# Altium footprint library Miscellaneous THD.PcbLib: 216 footprints (part 2 of 15) (continued)
## BELFUSE_L829-1J1T-43 [mm] "1 Port, Yellow/Green-Orange LEDs, Gigabit Ethernet, MagJack Connector Module" (continued)
Mechanical 14:
  lines w0.1: -8.79,20.2 ccw(c2.676,16.42) -8.923,13.07 -9.235,13.07 cw(c2.676,16.42) -8.79,21.07 ; -6.147,13.72 -6.147,21.07 ; -6.147,13.721 ccw(c-5.097,13.72) -4.047,13.719 -4.047,21.07 ; -5.7,21.07 -5.503,13.177 ; -5.466,13.157 ccw(c-5.097,13.89) -4.692,13.177 -4.494,21.07 ; 4.047,13.72 4.047,21.07 ; 4.047,13.721 ccw(c5.097,13.72) 6.147,13.719 6.147,21.07 ; 4.494,21.07 4.692,13.177 ; 4.728,13.157 ccw(c5.097,13.89) 5.503,13.177 5.7,21.07 ; 8.79,20.2 cw(c-2.676,16.42) 8.923,13.07 9.235,13.07 ccw(c-2.676,16.42) 8.79,21.07 ; -8.79,21.07 8.79,21.07 ; -8.79,21.07 -8.79,-3.06 8.79,-3.06 8.79,21.07
3D body "BELFUSE_L829-1J1T-43.stp": height 12.2, standoff -3.3, extent -9.694,-3.06 9.694,21.07

## BELFUSE_SI-16001-F [mm] "1 Port, Without LED, RJ45 10/100Base-T Ethernet Vertical Connector Module With Integrated Magnetics"
height 17.27
pads (12):
  round 1.6 hole 0.9: 1(-4.445,-1.27) 2(-3.175,1.27) 3(-1.905,-1.27) 4(-0.635,1.27) 5(0.635,-1.27) 6(1.905,1.27) 7(3.175,-1.27) 8(4.445,1.27)
  round 2.3 hole 1.6: 9(-7.875,-3.73) 10(7.875,-3.73)
  round 1 hole 3.2 unplated mask+1.1: M1(-5.715,-7.62) M2(5.715,-7.62)
Top Overlay:
  lines w0.2: -8.13,-5.259 -8.13,-14.4 8.13,-14.4 8.13,-5.259 ; -8.13,-2.201 -8.13,2.62 8.13,2.62 8.13,-2.201 ; -6.2,-9.56 -6.2,-10.87 ccw(c-6,-10.87) -6,-11.07 -3.595,-11.07 cw(c-3.595,-11.27) -3.395,-11.27 -3.395,-12.67 ccw(c-3.195,-12.67) -3.195,-12.87 -2.475,-12.87 cw(c-2.475,-13.07) -2.275,-13.07 -2.275,-14.05 2.275,-14.05 2.275,-13.07 cw(c2.475,-13.07) 2.475,-12.87 3.195,-12.87 ccw(c3.195,-12.67) 3.395,-12.67 3.395,-11.27 cw(c3.595,-11.27) 3.595,-11.07 6,-11.07 ccw(c6,-10.87) 6.2,-10.87 6.2,-9.56 ; -6.2,-5.68 -6.2,-3.96 cw(c-6,-3.96) -6,-3.76 6,-3.76 cw(c6,-3.96) 6.2,-3.96 6.2,-5.68 ; -5.955,-9.76 -3.15,-9.76 ; -5.955,-9.606 -5.955,-10.9 -3.15,-10.9 ; -5.955,-5.634 -5.955,-4.07 5.955,-4.07 5.955,-5.634 ; -3.78,-4.07 -3.78,-7.304 -3.32,-7.304 -3.32,-4.07 ; -2.764,-4.07 -2.764,-7.304 -2.304,-7.304 -2.304,-4.07 ; -1.748,-4.07 -1.748,-7.304 -1.288,-7.304 -1.288,-4.07 ; -0.732,-4.07 -0.732,-7.304 -0.272,-7.304 -0.272,-4.07 ; 0.284,-4.07 0.284,-7.304 0.744,-7.304 0.744,-4.07 ; 1.3,-4.07 1.3,-7.304 1.76,-7.304 1.76,-4.07 ; 2.316,-4.07 2.316,-7.304 2.776,-7.304 2.776,-4.07 ; 3.15,-10.9 5.955,-10.9 5.955,-9.606 ; 3.15,-9.76 5.955,-9.76 ; 3.332,-4.07 3.332,-7.304 3.792,-7.304 3.792,-4.07 ; -3.15,-12.57 -3.15,-8.49 3.15,-8.49 3.15,-12.57 2.03,-12.57 2.03,-13.87 -2.03,-13.87 -2.03,-12.57 -3.15,-12.57
Mechanical 8:
  lines w0.1: -8.375,-3.73 -7.875,-3.73 ; -7.875,-4.23 -7.875,-3.73 ; -7.875,-3.23 -7.875,-3.73 ; -7.375,-3.73 -7.875,-3.73 ; -6.215,-7.62 -5.715,-7.62 ; -5.715,-8.12 -5.715,-7.62 ; -5.715,-7.12 -5.715,-7.62 ; -5.215,-7.62 -5.715,-7.62 ; -4.945,-1.27 -4.445,-1.27 ; -4.445,-1.77 -4.445,-1.27 ; -4.445,-0.77 -4.445,-1.27 ; -3.945,-1.27 -4.445,-1.27 ; -3.675,1.27 -3.175,1.27 ; -3.175,0.77 -3.175,1.27 ; -3.175,1.77 -3.175,1.27 ; -2.675,1.27 -3.175,1.27 ; -2.405,-1.27 -1.905,-1.27 ; -1.905,-1.77 -1.905,-1.27 ; -1.905,-0.77 -1.905,-1.27 ; -1.405,-1.27 -1.905,-1.27 ; -1.135,1.27 -0.635,1.27 ; -0.635,0.77 -0.635,1.27 ; -0.635,1.77 -0.635,1.27 ; -0.5,0 0,0 ; -0.135,1.27 -0.635,1.27 ; 0,-0.5 0,0 ; 0,0.5 0,0 ; 0.135,-1.27 0.635,-1.27 ; 0.5,0 0,0 ; 0.635,-1.77 0.635,-1.27 ; 0.635,-0.77 0.635,-1.27 ; 1.135,-1.27 0.635,-1.27 ; 1.405,1.27 1.905,1.27 ; 1.905,0.77 1.905,1.27 ; 1.905,1.77 1.905,1.27 ; 2.405,1.27 1.905,1.27 ; 2.675,-1.27 3.175,-1.27 ; 3.175,-1.77 3.175,-1.27 ; 3.175,-0.77 3.175,-1.27 ; 3.675,-1.27 3.175,-1.27 ; 3.945,1.27 4.445,1.27 ; 4.445,0.77 4.445,1.27 ; 4.445,1.77 4.445,1.27 ; 4.945,1.27 4.445,1.27 ; 5.215,-7.62 5.715,-7.62 ; 5.715,-8.12 5.715,-7.62 ; 5.715,-7.12 5.715,-7.62 ; 6.215,-7.62 5.715,-7.62 ; 7.375,-3.73 7.875,-3.73 ; 7.875,-4.23 7.875,-3.73 ; 7.875,-3.23 7.875,-3.73 ; 8.375,-3.73 7.875,-3.73
Mechanical 14:
  lines w0.1: -6.635,-8.5 -5.449,-8.5 -5.449,-6.47 -6.635,-6.47 ; -5.955,-9.76 -3.15,-9.76 ; -5.955,-8.5 -5.955,-10.9 -3.15,-10.9 ; -5.955,-6.47 -5.955,-4.07 5.955,-4.07 5.955,-6.47 ; -3.78,-4.07 -3.78,-7.304 -3.32,-7.304 -3.32,-4.07 ; -2.764,-4.07 -2.764,-7.304 -2.304,-7.304 -2.304,-4.07 ; -1.748,-4.07 -1.748,-7.304 -1.288,-7.304 -1.288,-4.07 ; -0.732,-4.07 -0.732,-7.304 -0.272,-7.304 -0.272,-4.07 ; 0.284,-4.07 0.284,-7.304 0.744,-7.304 0.744,-4.07 ; 1.3,-4.07 1.3,-7.304 1.76,-7.304 1.76,-4.07 ; 2.316,-4.07 2.316,-7.304 2.776,-7.304 2.776,-4.07 ; 3.15,-10.9 5.955,-10.9 5.955,-8.5 ; 3.15,-9.76 5.954,-9.76 ; 3.332,-4.07 3.332,-7.304 3.792,-7.304 3.792,-4.07 ; 6.635,-8.5 5.48,-8.5 5.48,-6.47 6.635,-6.47 ; -8.13,-14.4 -8.13,2.62 8.13,2.62 8.13,-14.4 -8.13,-14.4 ; -6.635,-9.01 -6.2,-9.01 -6.2,-10.87 ccw(c-6,-10.87) -6,-11.07 -3.595,-11.07 cw(c-3.595,-11.27) -3.395,-11.27 -3.395,-12.67 ccw(c-3.195,-12.67) -3.195,-12.87 -2.475,-12.87 cw(c-2.475,-13.07) -2.275,-13.07 -2.275,-14.05 2.275,-14.05 2.275,-13.07 cw(c2.475,-13.07) 2.475,-12.87 3.195,-12.87 ccw(c3.195,-12.67) 3.395,-12.67 3.395,-11.27 cw(c3.595,-11.27) 3.595,-11.07 6,-11.07 ccw(c6,-10.87) 6.2,-10.87 6.2,-9.01 6.635,-9.01 6.635,-5.96 6.2,-5.96 6.2,-3.96 ccw(c6,-3.96) 6,-3.76 -6,-3.76 ccw(c-6,-3.96) -6.2,-3.96 -6.2,-5.96 -6.635,-5.96 -6.635,-9.01 ; -3.15,-12.57 -3.15,-8.49 3.15,-8.49 3.15,-12.57 2.03,-12.57 2.03,-13.87 -2.03,-13.87 -2.03,-12.57 -3.15,-12.57
3D body "BELFUSE_SI-16001-F.stp": height 17.02, standoff -4, extent -8.13,-14.4 8.13,2.62

## BELFUSE_SI-46014-F [mm] "1 Port, Yellow/ Green LEDs, RJ45 10/100Base-T Ethernet, MagJack® Vertical Connector Module"
height 17.27
pads (16):
  round 1.6 hole 0.9: 1(-4.445,-1.27) 2(-3.175,1.27) 3(-1.905,-1.27) 4(-0.635,1.27) 5(0.635,-1.27) 6(1.905,1.27) 7(3.175,-1.27) 8(4.445,1.27)
  round 1.7 hole 1: 9(-6.325,-11.73) 10(-3.785,-11.73) 11(3.785,-11.73) 12(6.325,-11.73)
  round 2.3 hole 1.6: 13(-7.875,-3.73) 14(7.875,-3.73)
  round 1 hole 3.2 unplated mask+1.1: M1(-5.715,-7.62) M2(5.715,-7.62)
Top Overlay:
  lines w0.2: -8.13,-5.259 -8.13,-14.4 8.13,-14.4 8.13,-5.259 ; -8.13,-2.201 -8.13,2.62 8.13,2.62 8.13,-2.201 ; -6.2,-10.537 -6.2,-9.56 ; -6.2,-5.68 -6.2,-3.96 cw(c-6,-3.96) -6,-3.76 6,-3.76 cw(c6,-3.96) 6.2,-3.96 6.2,-5.68 ; -5.955,-10.588 -5.955,-9.606 ; -5.955,-9.76 -3.15,-9.76 ; -5.955,-5.634 -5.955,-4.07 5.955,-4.07 5.955,-5.634 ; -5.458,-10.9 -4.652,-10.9 ; -5.323,-11.07 -4.787,-11.07 ; -3.78,-4.07 -3.78,-7.304 -3.32,-7.304 -3.32,-4.07 ; -3.195,-12.87 -2.475,-12.87 cw(c-2.475,-13.07) -2.275,-13.07 -2.275,-14.05 2.275,-14.05 2.275,-13.07 cw(c2.475,-13.07) 2.475,-12.87 3.195,-12.87 ; -3.15,-10.712 -3.15,-8.49 3.15,-8.49 3.15,-10.712 ; -2.928,-12.57 -2.03,-12.57 -2.03,-13.87 2.03,-13.87 2.03,-12.57 2.928,-12.57 ; -2.764,-4.07 -2.764,-7.304 -2.304,-7.304 -2.304,-4.07 ; -1.748,-4.07 -1.748,-7.304 -1.288,-7.304 -1.288,-4.07 ; -0.732,-4.07 -0.732,-7.304 -0.272,-7.304 -0.272,-4.07 ; 0.284,-4.07 0.284,-7.304 0.744,-7.304 0.744,-4.07 ; 1.3,-4.07 1.3,-7.304 1.76,-7.304 1.76,-4.07 ; 2.316,-4.07 2.316,-7.304 2.776,-7.304 2.776,-4.07 ; 3.15,-9.76 5.955,-9.76 ; 3.332,-4.07 3.332,-7.304 3.792,-7.304 3.792,-4.07 ; 4.652,-10.9 5.458,-10.9 ; 4.787,-11.07 5.323,-11.07 ; 5.955,-10.588 5.955,-9.606 ; 6.2,-10.537 6.2,-9.56
Mechanical 8:
  lines w0.05: -8.375,-3.73 -7.875,-3.73 ; -7.875,-4.23 -7.875,-3.73 ; -7.875,-3.23 -7.875,-3.73 ; -7.375,-3.73 -7.875,-3.73 ; -6.825,-11.73 -6.325,-11.73 ; -6.325,-12.23 -6.325,-11.73 ; -6.325,-11.23 -6.325,-11.73 ; -6.215,-7.62 -5.715,-7.62 ; -5.825,-11.73 -6.325,-11.73 ; -5.715,-8.12 -5.715,-7.62 ; -5.715,-7.12 -5.715,-7.62 ; -5.215,-7.62 -5.715,-7.62 ; -4.945,-1.27 -4.445,-1.27 ; -4.445,-1.77 -4.445,-1.27 ; -4.445,-0.77 -4.445,-1.27 ; -4.285,-11.73 -3.785,-11.73 ; -3.945,-1.27 -4.445,-1.27 ; -3.785,-12.23 -3.785,-11.73 ; -3.785,-11.23 -3.785,-11.73 ; -3.675,1.27 -3.175,1.27 ; -3.285,-11.73 -3.785,-11.73 ; -3.175,0.77 -3.175,1.27 ; -3.175,1.77 -3.175,1.27 ; -2.675,1.27 -3.175,1.27 ; -2.405,-1.27 -1.905,-1.27 ; -1.905,-1.77 -1.905,-1.27 ; -1.905,-0.77 -1.905,-1.27 ; -1.405,-1.27 -1.905,-1.27 ; -1.135,1.27 -0.635,1.27 ; -0.635,0.77 -0.635,1.27 ; -0.635,1.77 -0.635,1.27 ; -0.5,0 0,0 ; -0.135,1.27 -0.635,1.27 ; 0,-0.5 0,0 ; 0,0.5 0,0 ; 0.135,-1.27 0.635,-1.27 ; 0.5,0 0,0 ; 0.635,-1.77 0.635,-1.27 ; 0.635,-0.77 0.635,-1.27 ; 1.135,-1.27 0.635,-1.27 ; 1.405,1.27 1.905,1.27 ; 1.905,0.77 1.905,1.27 ; 1.905,1.77 1.905,1.27 ; 2.405,1.27 1.905,1.27 ; 2.675,-1.27 3.175,-1.27 ; 3.175,-1.77 3.175,-1.27 ; 3.175,-0.77 3.175,-1.27 ; 3.285,-11.73 3.785,-11.73 ; 3.675,-1.27 3.175,-1.27 ; 3.785,-12.23 3.785,-11.73 ; 3.785,-11.23 3.785,-11.73 ; 3.945,1.27 4.445,1.27 ; 4.285,-11.73 3.785,-11.73 ; 4.445,0.77 4.445,1.27 ; 4.445,1.77 4.445,1.27 ; 4.945,1.27 4.445,1.27 ; 5.215,-7.62 5.715,-7.62 ; 5.715,-8.12 5.715,-7.62 ; 5.715,-7.12 5.715,-7.62 ; 5.825,-11.73 6.325,-11.73 ; 6.215,-7.62 5.715,-7.62 ; 6.325,-12.23 6.325,-11.73 ; 6.325,-11.23 6.325,-11.73 ; 6.825,-11.73 6.325,-11.73 ; 7.375,-3.73 7.875,-3.73 ; 7.875,-4.23 7.875,-3.73 ; 7.875,-3.23 7.875,-3.73 ; 8.375,-3.73 7.875,-3.73
Mechanical 14:
  lines w0.1: -6.635,-8.5 -5.449,-8.5 -5.449,-6.47 -6.635,-6.47 ; -5.955,-9.76 -3.15,-9.76 ; -5.955,-8.5 -5.955,-10.9 -3.15,-10.9 ; -5.955,-6.47 -5.955,-4.07 5.955,-4.07 5.955,-6.47 ; -3.78,-4.07 -3.78,-7.304 -3.32,-7.304 -3.32,-4.07 ; -2.764,-4.07 -2.764,-7.304 -2.304,-7.304 -2.304,-4.07 ; -1.748,-4.07 -1.748,-7.304 -1.288,-7.304 -1.288,-4.07 ; -0.732,-4.07 -0.732,-7.304 -0.272,-7.304 -0.272,-4.07 ; 0.284,-4.07 0.284,-7.304 0.744,-7.304 0.744,-4.07 ; 1.3,-4.07 1.3,-7.304 1.76,-7.304 1.76,-4.07 ; 2.316,-4.07 2.316,-7.304 2.776,-7.304 2.776,-4.07 ; 3.15,-10.9 5.955,-10.9 5.955,-8.5 ; 3.15,-9.76 5.954,-9.76 ; 3.332,-4.07 3.332,-7.304 3.792,-7.304 3.792,-4.07 ; 6.635,-8.5 5.48,-8.5 5.48,-6.47 6.635,-6.47 ; -8.13,-14.4 8.13,-14.4 8.13,2.62 -8.13,2.62 -8.13,-14.4 ; -6.635,-9.01 -6.635,-5.96 -6.2,-5.96 -6.2,-3.96 cw(c-6,-3.96) -6,-3.76 6,-3.76 cw(c6,-3.96) 6.2,-3.96 6.2,-5.96 6.635,-5.96 6.635,-9.01 6.2,-9.01 6.2,-10.87 cw(c6,-10.87) 6,-11.07 3.595,-11.07 ccw(c3.595,-11.27) 3.395,-11.27 3.395,-12.67 cw(c3.195,-12.67) 3.195,-12.87 2.475,-12.87 ccw(c2.475,-13.07) 2.275,-13.07 2.275,-14.05 -2.275,-14.05 -2.275,-13.07 ccw(c-2.475,-13.07) -2.475,-12.87 -3.195,-12.87 cw(c-3.195,-12.67) -3.395,-12.67 -3.395,-11.27 ccw(c-3.595,-11.27) -3.595,-11.07 -6,-11.07 cw(c-6,-10.87) -6.2,-10.87 -6.2,-9.01 -6.635,-9.01 ; -3.15,-12.57 -2.03,-12.57 -2.03,-13.87 2.03,-13.87 2.03,-12.57 3.15,-12.57 3.15,-8.49 -3.15,-8.49 -3.15,-12.57
3D body "BELFUSE_SI-46014-F.stp": height 17.02, standoff -4, extent -8.13,-14.4 8.13,2.62

## BOMAR_364A2595 [mm] "Dual Right Angle 50 Ohm BNC Jack, White Valox Case"
height 29.3
pads (6):
  round 1.6 hole 0.9: 1(-6.2,2.54) 2(-6.2,0) 3(-6.2,-2.54) 4(-3.66,0)
  round 2.7 hole 2: 6(2.69,-5.08) 7(2.69,5.08)
Top Overlay:
  drawing of 182 lines, arcs and shapes, not listed
Mechanical 8:
  lines w0.1: -6.7,-2.54 -6.2,-2.54 ; -6.7,0 -6.2,0 ; -6.7,2.54 -6.2,2.54 ; -6.2,-3.04 -6.2,-2.54 ; -6.2,-2.04 -6.2,-2.54 ; -6.2,-0.5 -6.2,0 ; -6.2,0.5 -6.2,0 ; -6.2,2.04 -6.2,2.54 ; -6.2,3.04 -6.2,2.54 ; -5.7,-2.54 -6.2,-2.54 ; -5.7,0 -6.2,0 ; -5.7,2.54 -6.2,2.54 ; -4.16,0 -3.66,0 ; -3.66,-0.5 -3.66,0 ; -3.66,0.5 -3.66,0 ; -3.16,0 -3.66,0 ; -0.5,0 0,0 ; 0,-0.5 0,0 ; 0,0.5 0,0 ; 0.5,0 0,0 ; 2.19,-5.08 2.69,-5.08 ; 2.19,5.08 2.69,5.08 ; 2.69,-5.58 2.69,-5.08 ; 2.69,-4.58 2.69,-5.08 ; 2.69,4.58 2.69,5.08 ; 2.69,5.58 2.69,5.08 ; 3.19,-5.08 2.69,-5.08 ; 3.19,5.08 2.69,5.08
Mechanical 14:
  drawing of 182 lines, arcs and shapes, not listed
3D body "BOMAR_364A2595.stp": height 29.3, standoff -3.6, extent -9.85,-7.5 29.25,7.5

## BULGIN_PX0580-PC-COL [mm] "10A 250Vac PC Flange Rear Mount Inlet IEC Connector"
height 32.1
pads (5):
  round 2.4 hole 1.7: 1(9.14,0) 2(0,0) 3(-9.14,0)
  round 5.5 hole 3.4: 4(-20,9.65) 4(20,9.65)
Top Overlay:
  lines w0.2: -24.9,15.95 24.9,15.95 ; -14.785,18.35 -14.785,21.35 14.785,21.35 14.785,18.35 ; -13.3,0.45 -10.727,0.45 ; -13.3,3.35 -22.4,3.35 cw(c-22.4,5.85) -24.9,5.85 -24.9,18.35 24.9,18.35 24.9,5.85 cw(c22.4,5.85) 22.4,3.35 13.3,3.35 ; -13.3,15.95 -13.3,-3.55 13.3,-3.55 13.3,15.95 ; -7.553,0.45 -1.587,0.45 ; -7.539,0.45 -7.539,15.95 ; -1,-2.257 1,-2.257 ; -0.7,-2.657 0.7,-2.657 ; -0.4,-3.057 0.3,-3.057 ; 0,-2.257 0,-1.657 ; 1.587,0.45 7.553,0.45 ; 7.539,0.45 7.539,15.95 ; 10.727,0.45 13.3,0.45
  text "L" at 8.843,-3.075 h1.5
  text "N" at -9.602,-3.075 h1.5
Mechanical 8:
  lines w0.1: -21,9.65 -20,9.65 ; -20,8.65 -20,9.65 ; -20,10.65 -20,9.65 ; -19,9.65 -20,9.65 ; -10.14,0 -9.14,0 ; -9.14,-1 -9.14,0 ; -9.14,1 -9.14,0 ; -8.14,0 -9.14,0 ; -1,0 0,0 ; 0,-1 0,0 ; 0,1 0,0 ; 1,0 0,0 ; 8.14,0 9.14,0 ; 9.14,-1 9.14,0 ; 9.14,1 9.14,0 ; 10.14,0 9.14,0 ; 19,9.65 20,9.65 ; 20,8.65 20,9.65 ; 20,10.65 20,9.65 ; 21,9.65 20,9.65
Mechanical 14:
  circle w0.1: c20,9.65 r1.7
  circle w0.1: c-20,9.65 r1.7
  lines w0.1: -24.9,15.95 24.9,15.95 ; -14.785,18.35 -14.785,21.35 14.785,21.35 14.785,18.35 ; -13.3,0.45 13.3,0.45 ; -13.3,3.35 -22.4,3.35 cw(c-22.4,5.85) -24.9,5.85 -24.9,18.35 24.9,18.35 24.9,5.85 cw(c22.4,5.85) 22.4,3.35 13.3,3.35 ; -13.3,15.95 -13.3,-3.55 13.3,-3.55 13.3,15.95 ; -7.539,0.45 -7.539,15.95 ; -1,-2.257 1,-2.257 ; -0.7,-2.657 0.7,-2.657 ; -0.4,-3.057 0.3,-3.057 ; 0,-2.257 0,-1.657 ; 7.539,0.45 7.539,15.95
  text "L" at 8.843,-3.075 h1.5
  text "N" at -9.602,-3.075 h1.5
3D body "BULGIN_PX0580-PC-COL.stp": height 27.8, standoff -3.6, extent -24.9,-3.55 24.9,21.35

## BULGIN_PX0675-PC-COL [mm] "10A 250Vac PC Flange Rear Mount Outlet IEC Connector"
height 30.4
pads (5):
  round 2.4 hole 1.7: 1(-7,0) 2(0,0) 3(7,0)
  round 5.5 hole 3.4: 4(-20,15.1) 4(20,15.1)
Top Overlay:
  lines w0.2: -25.05,21.5 25.05,21.5 ; -16.975,23.8 -16.95,23.825 -16.95,27.1 16.95,27.1 16.95,23.8 ; -15.9,8.7 -21.55,8.7 cw(c-21.55,12.2) -25.05,12.2 -25.05,23.8 25.05,23.8 25.05,12.2 cw(c21.55,12.2) 21.55,8.7 15.9,8.7 ; -15.9,21.5 -15.9,6.9 15.9,6.9 15.9,21.5 ; -14.775,6.9 -14.775,5.77 -13.65,5.77 ; -13.65,6.9 -13.65,0.9 -8.786,0.9 ; -5.214,0.9 -4.4,0.9 ; -1.67,-1.1 -4.4,-1.1 -4.4,0.9 ; -0.9,3 1.1,3 ; -0.6,2.6 0.8,2.6 ; -0.4,-1.96 -0.4,-11.1 0.4,-11.1 0.4,-1.96 ; -0.3,2.2 0.4,2.2 ; 0.1,3 0.1,3.6 ; 1.67,-1.1 4.4,-1.1 4.4,0.9 ; 5.214,0.9 4.4,0.9 ; 8.786,0.9 13.65,0.9 13.65,6.9 ; 9,6.9 9,21.5 ; 13.65,5.77 14.775,5.77 14.775,6.9 ; -4.4,0.9 -2.5,0.9 -2.5,3.5 -3.9,3.5 -3.9,6.1 3.9,6.1 3.9,3.5 2.5,3.5 2.5,0.9 4.4,0.9 ; -9,6.9 -9,21.5 -9,6.9
  text "N" at 6.53,2.055 h1.5
  text "L" at -7.47,2.055 h1.5
Mechanical 8:
  lines w0.1: -21,15.1 -20,15.1 ; -20,14.1 -20,15.1 ; -20,16.1 -20,15.1 ; -19,15.1 -20,15.1 ; -8,0 -7,0 ; -7,-1 -7,0 ; -7,1 -7,0 ; -6,0 -7,0 ; -1,0 0,0 ; 0,-1 0,0 ; 0,1 0,0 ; 1,0 0,0 ; 6,0 7,0 ; 7,-1 7,0 ; 7,1 7,0 ; 8,0 7,0 ; 19,15.1 20,15.1 ; 20,14.1 20,15.1 ; 20,16.1 20,15.1 ; 21,15.1 20,15.1
Mechanical 14:
  circle w0.1: c20,15.1 r1.7
  circle w0.1: c-20,15.1 r1.7
  lines w0.1: -25.05,21.5 25.05,21.5 ; -16.95,23.8 -16.95,27.1 16.95,27.1 16.95,23.8 ; -15.9,8.7 -21.55,8.7 cw(c-21.55,12.2) -25.05,12.2 -25.05,23.8 25.05,23.8 25.05,12.2 cw(c21.55,12.2) 21.55,8.7 15.9,8.7 ; -15.9,21.5 -15.9,6.9 15.9,6.9 15.9,21.5 ; -14.775,6.9 -14.775,5.77 -13.65,5.77 ; -13.65,6.9 -13.65,0.9 -8.5,0.9 -8.5,-0.4 -5.7,-0.4 -5.7,0.9 -4.4,0.9 ; -8.5,0.4 -5.7,0.4 ; -0.9,3 1.1,3 ; -0.6,2.6 0.8,2.6 ; -0.4,-0.4 -0.4,-11.1 0.4,-11.1 0.4,-0.4 ; -0.3,2.2 0.4,2.2 ; 0.1,3 0.1,3.6 ; 5.7,0.4 8.5,0.4 ; 9,6.9 9,21.5 ; 13.65,5.77 14.775,5.77 14.775,6.9 ; 13.65,6.9 13.65,0.9 8.5,0.9 8.5,-0.373 5.7,-0.373 5.7,0.9 4.4,0.9 ; -4.4,0.9 -2.5,0.9 -2.5,3.5 -3.9,3.5 -3.9,6.1 3.9,6.1 3.9,3.5 2.5,3.5 2.5,0.9 4.4,0.9 ; -4.4,0.9 -4.4,-1.1 -1.6,-1.1 -1.6,0.9 1.6,0.9 1.6,-1.1 4.4,-1.1 4.4,0.9 ; -9,6.9 -9,21.5 -9,6.9 ; -1.4,-0.4 1.4,-0.4 1.4,0.4 -1.4,0.4 -1.4,-0.4
  text "N" at 6.53,2.055 h1.5
  text "L" at -7.47,2.055 h1.5
3D body "BULGIN_PX0675-PC-COL.stp": height 30.4, standoff -3.6, extent -25.05,-11.2 25.05,27.1

## CABLECOM_BF64T42AB-P [mm] "DIN 41612, Type B, Thru-Hole; Rows a+b, 64 Position, Straight Female Connector"
height 11.6
pads (66):
  round 1.7 hole 1: a1(0,0) a2(0,-2.54) a3(0,-5.08) a4(0,-7.62) a5(0,-10.16) a6(0,-12.7) a7(0,-15.24) a8(0,-17.78) a9(0,-20.32) a10(0,-22.86) a11(0,-25.4) a12(0,-27.94) a13(0,-30.48) a14(0,-33.02) a15(0,-35.56) a16(0,-38.1) a17(0,-40.64) a18(0,-43.18) a19(0,-45.72) a20(0,-48.26) a21(0,-50.8) a22(0,-53.34) a23(0,-55.88) a24(0,-58.42) a25(0,-60.96) a26(0,-63.5) a27(0,-66.04) a28(0,-68.58) a29(0,-71.12) a30(0,-73.66) a31(0,-76.2) a32(0,-78.74) b1(2.54,0) b2(2.54,-2.54) b3(2.54,-5.08) b4(2.54,-7.62) b5(2.54,-10.16) b6(2.54,-12.7) b7(2.54,-15.24) b8(2.54,-17.78) b9(2.54,-20.32) b10(2.54,-22.86) b11(2.54,-25.4) b12(2.54,-27.94) b13(2.54,-30.48) b14(2.54,-33.02) b15(2.54,-35.56) b16(2.54,-38.1) b17(2.54,-40.64) b18(2.54,-43.18) b19(2.54,-45.72) b20(2.54,-48.26) b21(2.54,-50.8) b22(2.54,-53.34) b23(2.54,-55.88) b24(2.54,-58.42) b25(2.54,-60.96) b26(2.54,-63.5) b27(2.54,-66.04) b28(2.54,-68.58) b29(2.54,-71.12) b30(2.54,-73.66) b31(2.54,-76.2) b32(2.54,-78.74)
  round 3.5 / inner round 3.5 / far side round 5.1 hole 2.8: MTG1(2.24,5.63) MTG2(2.24,-84.37)
Top Overlay:
  lines w0.2: -1.08,-79.525 -1.08,-81.22 ; -1.08,0.785 -1.08,2.48 ; -0.71,-86.82 -0.71,-84.37 ; -0.71,5.63 -0.71,8.08 ; 1.105,-86.82 -2.73,-86.82 -2.73,8.08 1.105,8.08 ; 3.375,-86.82 5.27,-86.82 5.27,8.08 3.375,8.08 ; 3.532,-81.87 5.27,-81.87 ; 3.62,-79.525 3.62,-80.17 ; 3.62,0.785 3.62,1.43 ; -1.73,-81.87 1.17,-81.87 ; -1.73,-81.87 -1.73,3.13 ; -1.73,-81.87 -1.08,-81.22 ; -1.73,3.13 -1.08,2.48 ; -1.73,3.13 1.17,3.13 ; -1.08,-81.22 0.52,-81.22 ; -1.08,2.48 0.52,2.48 ; 0.52,-81.22 1.17,-81.87 ; 0.52,-81.22 0.52,-80.17 ; 0.52,-80.17 3.62,-80.17 ; 0.52,-80.17 1.17,-80.82 ; 0.52,1.43 3.62,1.43 ; 0.52,1.43 0.52,2.48 ; 0.52,1.43 1.17,2.08 ; 0.52,2.48 1.17,3.13 ; 1.17,-81.87 1.17,-80.82 ; 1.17,-80.82 4.27,-80.82 ; 1.17,2.08 1.17,3.13 ; 1.17,2.08 4.27,2.08 ; 3.62,-80.17 4.27,-80.82 ; 3.62,1.43 4.27,2.08 ; 4.27,-80.82 4.27,2.08
  text "b" at 4.064,2.556 h1.2
  text "a" at -1.651,3.81 h1.2
  text "32" at -5.25,-79.415 h1.2
  text "5" at -4.025,-10.885 h1.2
  text "10" at -4.95,-23.535 h1.2
  text "30" at -5.25,-74.335 h1.2
  text "25" at -5.25,-61.635 h1.2
  text "20" at -5.25,-48.935 h1.2
  text "15" at -4.95,-36.235 h1.2
  text "1" at -3.825,-0.725 h1.2
Mechanical 8:
  drawing of 264 lines, arcs and shapes, not listed
Mechanical 14:
  circle w0.1: c2.24,5.63 r1.4
  circle w0.1: c2.24,-84.37 r1.4
  lines w0.1: -0.71,-86.82 -0.71,-84.37 cw(c1.79,-84.37) 1.794,-81.87 ; -0.71,8.08 -0.71,5.63 ccw(c1.79,5.63) 1.794,3.13 ; 1.207,-81.87 -1.73,-81.87 ; 1.79,-81.87 5.27,-81.87 ; 1.79,3.13 3.625,3.13 ; -1.73,-81.87 -1.73,3.13 ; -1.73,-81.87 -1.08,-81.22 ; -1.73,3.13 -1.08,2.48 ; -1.73,3.13 1.17,3.13 ; -1.08,-81.22 0.52,-81.22 ; -1.08,-81.22 -1.08,2.48 ; -1.08,2.48 0.52,2.48 ; 0.52,-81.22 0.52,-80.17 ; 0.52,-81.22 1.17,-81.87 1.17,-80.82 ; 0.52,-80.17 3.62,-80.17 ; 0.52,-80.17 1.17,-80.82 ; 0.52,1.43 3.62,1.43 ; 0.52,1.43 0.52,2.48 ; 0.52,1.43 1.17,2.08 ; 0.52,2.48 1.17,3.13 ; 1.17,-80.82 4.27,-80.82 ; 1.17,2.08 1.17,3.13 ; 1.17,2.08 4.27,2.08 ; 3.62,-80.17 3.62,1.43 ; 3.62,-80.17 4.27,-80.82 ; 3.62,1.43 4.27,2.08 ; 4.27,-80.82 4.27,2.08 ; -2.73,-86.82 5.27,-86.82 5.27,8.08 -2.73,8.08 -2.73,-86.82
  text "1" at -3.825,-0.725 h1.2
  text "b" at 4.064,2.556 h1.2
  text "a" at -1.651,3.81 h1.2
  text "32" at -5.25,-79.415 h1.2
  text "5" at -4.025,-10.885 h1.2
  text "10" at -4.95,-23.535 h1.2
  text "15" at -4.95,-36.235 h1.2
  text "20" at -5.25,-48.935 h1.2
  text "25" at -5.25,-61.635 h1.2
  text "30" at -5.25,-74.335 h1.2
Drill Drawing:
  lines w0.1: -1.8,-58.42 -1.8,-81.28 4.4,-81.28 4.4,2.54 -1.8,2.54 -1.8,-20.32
  text "PRESS-FIT TECHNOLOGY diam. 1mm +/-0.05" at -1.925,-55.05 h1
3D body "CABLECOM_BF64T42AB-P.stp": height 11.6, standoff -4.5, extent -2.73,-86.82 5.27,8.08

## CAMDEN_CTB9350/2A [mm] "12A 380V, Pitch: 5mm, 2 Positions, Horizontal  Male Terminal Block"
height 8.3
pads (2):
  round 2.1 hole 1.4: 1(-2.5,0) 2(2.5,0)
Top Overlay:
  lines w0.2: -5.605,-7 5.595,-7 ; -3.48,-10 -3.11,-8.7 -1.9,-8.7 -1.53,-10 ; 1.52,-10 1.89,-8.7 3.1,-8.7 3.47,-10 ; -5.605,-10 -5.605,2 5.595,2 5.595,-10 -5.605,-10
  text "2" at 2.24,-2.625 h1
  text "1" at -2.7,-2.65 h1
Mechanical 8:
  lines w0.1: -3,0 -2.5,0 ; -2.54,0 -2.54,0.5 ; -2.5,-0.5 -2.5,0 ; -2.5,0.5 -2.5,0 ; -2,0 -2.5,0 ; -0.5,0 0,0 ; 0,-0.5 0,0 ; 0,0.5 0,0 ; 0.5,0 0,0 ; 2,0 2.5,0 ; 2.5,-0.5 2.5,0 ; 2.5,0.5 2.5,0 ; 3,0 2.5,0
Mechanical 14:
  lines w0.1: -5.605,-7 5.595,-7 ; -3.48,-10 -3.11,-8.7 -1.9,-8.7 -1.53,-10 ; 1.52,-10 1.89,-8.7 3.1,-8.7 3.47,-10 ; -5.605,-10 -5.605,2 5.595,2 5.595,-10 -5.605,-10
  text "2" at 2.24,-2.625 h1
  text "1" at -2.7,-2.65 h1
3D body "CAMDEN_CTB9350-2A.stp": height 8.3, standoff -3.5, extent -5.605,-10 5.595,2

## CAMDEN_CTB9550/2 [mm] "12A, 750V, Pitch: 7.5mm, 2 Positions, Horizontal  Male Terminal Block"
height 8.3
pads (2):
  round 2.1 hole 1.4: 1(-3.75,0) 2(3.75,0)
Top Overlay:
  lines w0.2: -7.505,-7 7.495,-7 ; -4.73,-10 -4.36,-8.7 -3.15,-8.7 -2.78,-10 ; 2.77,-10 3.14,-8.7 4.35,-8.7 4.72,-10 ; -7.505,-10 7.495,-10 7.495,2 -7.505,2 -7.505,-10
  text "2" at 3.49,-2.625 h1
  text "1" at -3.95,-2.65 h1
Mechanical 8:
  lines w0.1: -4.25,0 -3.75,0 ; -3.75,-0.5 -3.75,0 ; -3.75,0.5 -3.75,0 ; -3.25,0 -3.75,0 ; -0.5,0 0,0 ; 0,-0.5 0,0 ; 0,0.5 0,0 ; 0.5,0 0,0 ; 3.25,0 3.75,0 ; 3.75,-0.5 3.75,0 ; 3.75,0.5 3.75,0 ; 4.25,0 3.75,0
Mechanical 14:
  lines w0.1: -7.505,-7 7.495,-7 ; -4.73,-10 -4.36,-8.7 -3.15,-8.7 -2.78,-10 ; 2.77,-10 3.14,-8.7 4.35,-8.7 4.72,-10 ; -7.505,-10 7.495,-10 7.495,2 -7.505,2 -7.505,-10
  text "2" at 3.49,-2.625 h1
  text "1" at -3.95,-2.65 h1
3D body "CAMDEN_CTB9550-2.stp": height 8.3, standoff -3.5, extent -7.505,-10 7.495,2

## CINCH_105-2201-201 [mm] "White Tip Jack, Vertical For Banana 2mm"
height 8.26
pads (1):
  round 2.1 hole 1.4: 1(0,0)
Top Overlay:
  circle w0.2: c0,0 r2.59
Mechanical 8:
  circle w0.05: c0,0 r0.7
  lines w0.05: 0,0 0,0.5 0,0 ; 0,0 0,-0.5 0,0 ; 0,0 -0.5,0 0,0 ; 0,0 0.5,0 0,0
Mechanical 14:
  circle w0.1: c0,0 r2.59
3D body "CINCH_105-2201-201.stp": height 8.26, standoff -3.48, extent -2.59,-2.59 2.59,2.59

## CINCH_105-2202-201 [mm] "Red Tip Jack, Vertical For Banana 2mm"
height 8.26
pads (1):
  round 2.1 hole 1.4: 1(0,0)
Top Overlay:
  circle w0.2: c0,0 r2.59
Mechanical 8:
  circle w0.05: c0,0 r0.7
  lines w0.05: 0,0 0.5,0 0,0 ; 0,0 -0.5,0 0,0 ; 0,0 0,-0.5 0,0 ; 0,0 0,0.5 0,0
Mechanical 14:
  circle w0.1: c0,0 r2.59
3D body "CINCH_105-2202-201.stp": height 8.26, standoff -3.48, extent -2.59,-2.59 2.59,2.59

## CINCH_105-2203-201 [mm] "Black Tip Jack, Vertical For Banana 2mm"
height 8.26
pads (1):
  round 2.1 hole 1.4: 1(0,0)
Top Overlay:
  circle w0.2: c0,0 r2.59
Mechanical 8:
  circle w0.05: c0,0 r0.7
  lines w0.05: 0,0 0,0.5 0,0 ; 0,0 0,-0.5 0,0 ; 0,0 -0.5,0 0,0 ; 0,0 0.5,0 0,0
Mechanical 14:
  circle w0.1: c0,0 r2.59
3D body "CINCH_105-2203-201.stp": height 8.26, standoff -3.48, extent -2.59,-2.59 2.59,2.59

## CINCH_105-2204-201 [mm] "Green Tip Jack, Vertical For Banana 2mm"
height 8.26
pads (1):
  round 2.1 hole 1.4: 1(0,0)
Top Overlay:
  circle w0.2: c0,0 r2.59
Mechanical 8:
  circle w0.05: c0,0 r0.7
  lines w0.05: 0,0 0,0.5 0,0 ; 0,0 0,-0.5 0,0 ; 0,0 -0.5,0 0,0 ; 0,0 0.5,0 0,0
Mechanical 14:
  circle w0.1: c0,0 r2.59
3D body "CINCH_105-2204-201.stp": height 8.26, standoff -3.48, extent -2.59,-2.59 2.59,2.59